# Altium footprint library lib.PcbLib: 145 footprints (part 1 of 10)
Each footprint in its own frame and in the unit in brackets; x right, y up, seen from the top. Pads: shape width x height; smd on the part's side, far side on the other; paste and mask are expansions set on the pad; w line width, h text height; cw(c..) or ccw(c..) is an arc to the next point about the centre after c.
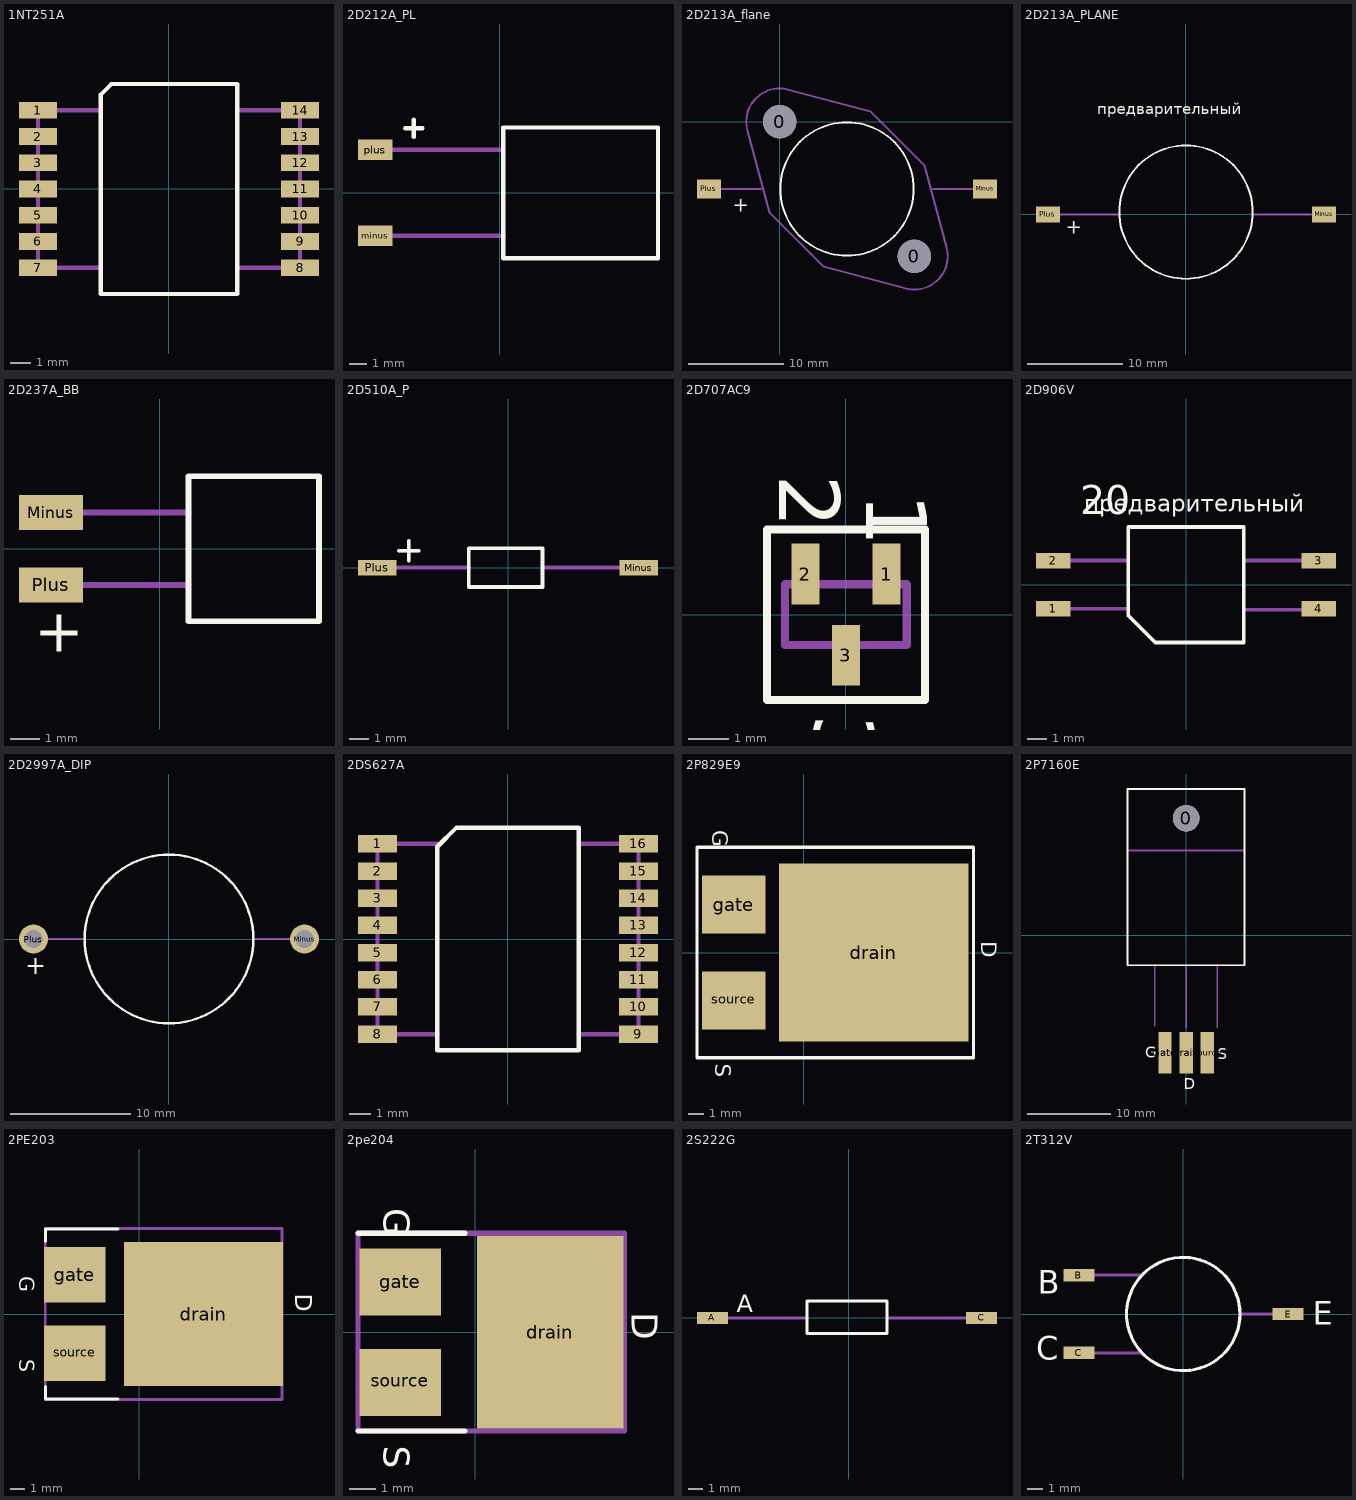
[diagram p0: the footprints below, top view; thin cyan lines are the x and y axes]

## 1NT251A [mm]
pads (14):
  rect 1.8x0.8 smd: 1(-6.25,3.75) 2(-6.25,2.5) 3(-6.25,1.25) 4(-6.25,0) 5(-6.25,-1.25) 6(-6.25,-2.5) 7(-6.25,-3.75) 8(6.25,-3.75) 9(6.25,-2.5) 10(6.25,-1.25) 11(6.25,0) 12(6.25,1.25) 13(6.25,2.5) 14(6.25,3.75)
Top Overlay:
  lines w0.2: -3.25,-5 -3.25,4.5 -2.75,5 3.25,5 3.25,-5 -3.25,-5
Mechanical 5:
  lines w0.2: -3.25,-3.75 -6.25,-3.75 -6.25,3.75 -3.25,3.75 ; 3.25,-3.75 6.25,-3.75 6.25,3.75 3.25,3.75
Mechanical 25:
  text "1" at -4.325,3.275 h2
  text "7" at -4.425,-4.525 h2
  text "8" at 4.025,-4.45 h2
  text "14" at 3.375,3.1 h2
3D body "401_14_03.stp": height 3.1, standoff 0, extent -6.6,-4.9 6.6,4.9

## 2D212A_PL [mm]
height 4
pads (2):
  rect 2x1.2 smd: minus(-7.25,-2.5) plus(-7.25,2.5)
Top Overlay:
  lines w0.254: -5.5,3.75 -4.5,3.75 ; -5,3.25 -5,4.25 ; 0.2,-3.8 0.2,3.8 9.2,3.8 9.2,-3.8 0.2,-3.8
Mechanical 5:
  lines w0.254: -7.25,-2.5 0.2,-2.5 ; -7.25,2.5 0.1,2.5
Mechanical 25:
  text "+" at -5.975,1.625 h2
3D body "2d212a_co.stp": height 4, standoff 0, extent -7.2,-4.1 9.3,3.9

## 2D213A_flane [mm] "m=4,0g"
height 4.5
pads (4):
  round 3.5 hole 3.5 unplated: 0(0,0)
  round 3.5 hole 3.5 unplated mask+0.102: 0(14.14,-14.14)
  rect 2.5x2 smd: Minus(21.57,-7.058) Plus(-7.43,-7.058)
Top Overlay:
  circle w0.2: c7.07,-7.074 r7
  text "+" at -4.93,-9.439 h1.5
Mechanical 5:
  lines w0.2: -7.555,-7.064 -1.93,-7.064 ; 0.97,3.33 9.52,1.08 15.22,-4.62 17.52,-13.17 ; 0.974,3.343 ccw(c-0.012,-0.015) -3.379,-0.97 -1.08,-9.52 4.62,-15.22 13.27,-17.52 ; 13.225,-17.5 ccw(c14.152,-14.125) 17.528,-13.204 ; 16.07,-7.064 21.445,-7.064
3D body: height 4, standoff 0, extent -3.5,-17.7 17.6,3.5
3D body: height 4.5, standoff 0, extent 0,-14.1 14,-0.1

## 2D213A_PLANE [mm] "m=4,0g"
height 4.5
pads (2):
  rect 2.5x1.7 smd: Minus(14.5,0) Plus(-14.5,0)
Top Overlay:
  circle w0.2: c0,0.25 r7
  text "+" at -12.6,-2 h1.5
  text "предварительный" at -9.3,10.1 h2
Mechanical 5:
  lines w0.2: -13.25,0 -7,0 ; 7,0 13.125,0

## 2D237A_BB [mm] "Install 11 massa 0.9 Form 41a.2147.025.06(ili po shertegu)"
height 2.5
pads (2):
  rect 2.2x1.2 smd: Minus(-3.75,1.25) Plus(-3.75,-1.25)
Top Overlay:
  lines w0.2: 1,-2.5 5.5,-2.5 5.5,2.5 1,2.5 1,-2.5
  text "+" at -4.318,-3.556 h1.5
Mechanical 5:
  lines w0.2: -4.25,1.25 1,1.25 ; -4,-1.25 1,-1.25
Mechanical 25:
  text "+" at -4,-3.1 h2

## 2D510A_P [mm]
height 1.8
pads (2):
  rect 2x0.8 smd: Minus(6.75,0) Plus(-6.75,0)
Top Overlay:
  lines w0.2: -5.625,0.875 -4.625,0.875 ; -5.125,0.375 -5.125,1.375 ; -2.025,-1 1.775,-1 1.775,1 -2.025,1 -2.025,-1
Mechanical 5:
  lines w0.2: -5.875,0 -2,0 ; 1.875,0 5.75,0
Mechanical 25:
  lines w0.2: -5.625,0.875 -4.625,0.875 ; -5.125,0.375 -5.125,1.375
3D body "2d510a.stp": height 1.8, standoff 0, extent -7.25,-0.9 7.25,0.9

## 2D707AC9 [mm] "М=0,01г, пластмассовый корпус, без прокладки,ручная пайка"
height 1.2
pads (3):
  rect 0.7x1.5 smd: 1(1,1) 2(-1,1) 3(0,-1)
Top Overlay:
  lines w0.2: -1.95,-2.1 1.95,-2.1 1.95,2.1 -1.95,2.1 -1.95,-2.1
  text "1" at 0.5,3 h1.5
  text "2" at -1.65,3.45 h1.5
  text "3" at -0.8,-2.45 h1.5
Mechanical 5:
  lines w0.2: -1,0.75 -1,1.25 ; 0,-1.25 0,-0.75 ; 1,0.75 1,1.25 ; -1.5,-0.75 -1.5,0.75 1.5,0.75 1.5,-0.75 -1.5,-0.75
Mechanical 25:
  text "3" at -0.65,-2.05 h2
  text "2" at -1.55,2.85 h2
  text "1" at 0.5,2.5 h2
3D body "2t3130a.stp": height 1.2, standoff 0, extent -1.5,-1.25 1.5,1.25

## 2D906V [mm]
height 3
pads (4):
  rect 1.8x0.8 smd: 1(-6.9,-1.25) 2(-6.9,1.25) 3(6.9,1.25) 4(6.9,-1.25)
Top Overlay:
  lines w0.2: -3,-1.6 -1.6,-3 3,-3 3,3 -3,3 -3,-1.6
  text "20" at -5.5,3.65 h1.5
  text "предварительный" at -5.3,3.5 h1.5
Mechanical 5:
  lines w0.2: -6.95,-1.25 -3.05,-1.25 ; -6.85,1.25 -3.1,1.25 ; 3.05,-1.3 6.95,-1.3 ; 3.05,1.25 6.8,1.25
Mechanical 25:
  text "4" at 4.55,-2.05 h3
  text "3" at 4.7,0.55 h3
  text "2" at -5.5,0.45 h3
  text "1" at -5.55,-2 h3

## 2D2997A_DIP [mm] "m=4,0g"
height 4.5
pads (2):
  round 2.4 hole 1.5: Minus(11.25,0) Plus(-11.25,0)
Top Overlay:
  circle w0.2: c0,0 r7
  text "+" at -11.943,-2.931 h1.5
Mechanical 5:
  lines w0.2: -11.25,0 -7,0 ; 7,0 11.25,0
Mechanical 25:
  text "+" at -11.75,-2.875 h2

## 2DS627A [mm]
height 2.8
pads (16):
  rect 1.8x0.8 smd: 1(-6,4.375) 2(-6,3.125) 3(-6,1.875) 4(-6,0.625) 5(-6,-0.625) 6(-6,-1.875) 7(-6,-3.125) 8(-6,-4.375) 9(6,-4.375) 10(6,-3.125) 11(6,-1.875) 12(6,-0.625) 13(6,0.625) 14(6,1.875) 15(6,3.125) 16(6,4.375)
Top Overlay:
  lines w0.2: -3.25,-5.125 -3.25,4.245 -2.37,5.125 3.25,5.125 3.25,-5.125 -3.25,-5.125
Mechanical 5:
  lines w0.2: -3.25,-4.375 -6,-4.375 -6,4.375 -3.25,4.375 ; 3.25,-4.375 6,-4.375 6,4.375 3.25,4.375
Mechanical 25:
  text "9" at 4,-5.025 h2
  text "8" at -4.6,-5.025 h2
  text "16" at 3.556,3.812 h2
  text "1" at -4.572,3.812 h2
3D body "CFP125P1240X250-16N.step": height 2.5, standoff 0, extent -6.25,-5 6.25,5

## 2P829E9 [mm]
height 3.6
pads (3):
  rect 12.05x11.35 smd: drain(4.45,0)
  rect 4.05x3.7 smd: gate(-4.45,3.05) source(-4.45,-3.05)
Top Overlay:
  lines w0.2: -6.8,-6.7 10.8,-6.7 10.8,6.7 -6.8,6.7 -6.8,-6.7
  text "D" at 11.3,0.725 h1
  text "S" at -5.625,-7.075 h1
  text "G" at -5.825,7.8 h1
Top Paste:
  region: -1.275,0.25 2.325,0.25 2.325,5.25 -1.275,5.25
  region: 2.725,0.25 6.325,0.25 6.325,5.25 2.725,5.25
  region: 6.725,0.25 10.225,0.25 10.225,5.25 6.725,5.25
  region: 6.725,-5.25 10.225,-5.25 10.225,-0.25 6.725,-0.25
  region: 2.725,-5.25 6.325,-5.25 6.325,-0.25 2.725,-0.25
  region: -1.275,-5.25 2.325,-5.25 2.325,-0.25 -1.275,-0.25
Mechanical 25:
  text "D" at 11.075,0.575 h1.5
  text "S" at -5.3,-5.35 h1.5
  text "G" at -4.9,6.35 h1.5
3D body: height 3.6, standoff 0.4, extent -6.8,-6.7 10.8,6.7
3D body: height 0.4, standoff 0, extent -1.6,-5.6 10.4,5.7
3D body: height 0.4, standoff 0, extent -6.4,1.2 -2.4,4.8
3D body: height 0.4, standoff 0, extent -6.4,-4.8 -2.4,-1.2

## 2P7160E [mm]
height 6.6
pads (4):
  round 3.2 hole 3.2 unplated: 0(0,14.063)
  rect 1.6x5 smd: Drain(0,-14.062) Gate(-2.54,-14.062) Source(2.54,-14.062)
Top Overlay:
  lines w0.2: -7.025,17.562 -7.025,-3.562 7,-3.562 7,17.562 -7,17.562
  text "D" at -0.3,-18.425 h1.31
  text "S" at 3.825,-14.875 h1.31
  text "G" at -4.875,-14.675 h1.31
Mechanical 5:
  lines w0.2: -7,10.188 -1.225,10.188 1.875,10.188 5,10.188 6.875,10.188 ; -3.767,-3.537 -3.75,-3.687 -3.75,-10.812 ; 0,-11.063 0,-3.562 ; 3.75,-11.063 3.75,-3.562
Mechanical 25:
  text "S" at 2.1,-11.3 h2
  text "D" at -0.5,-11.1 h2
  text "G" at -3,-11.2 h2

## 2PE203 [mm]
height 3.6
pads (3):
  rect 10.75x9.75 smd: drain(4.35,0)
  rect 4.15x3.75 smd: gate(-4.35,2.665) source(-4.35,-2.665)
Top Overlay:
  lines w0.2: -6.35,-4.89 -6.35,-5.75 -1.45,-5.75 ; -6.35,4.89 -6.35,5.75 -1.45,5.75
  text "D" at 10.15,1.375 h2
  text "G" at -8.129,2.54 h1
  text "S" at -8.129,-3.048 h1
Top Paste:
  rectangle: 3.025,0.375 5.775,4.375
  rectangle: 6.65,0.375 9.275,4.375
  rectangle: 6.525,-4.25 9.15,-0.455
  rectangle: 3.025,-4.25 5.831,-0.455
  rectangle: -0.35,0.375 2.275,4.375
  rectangle: -0.419,-4.25 2.275,-0.455
Mechanical 5:
  lines w0.2: -6.355,-5.77 9.655,-5.77 9.655,5.77 -6.355,5.77 -6.355,-5.77
Mechanical 25:
  text "D" at 10.15,2.625 h2
  text "G" at -5.1,5.75 h2
  text "S" at -4.725,-4.75 h2
3D body: height 3.6, standoff 0, extent -6.4,-5.8 9.7,5.8

## 2pe204 [mm]
height 3.05
pads (3):
  rect 5.55x7.3 smd: drain(2.85,0)
  rect 3.1x2.55 smd: gate(-2.85,1.905) source(-2.85,-1.905)
Top Overlay:
  lines w0.2: -4.45,-3.75 -0.4,-3.75 ; -4.45,3.75 -0.4,3.75
  text "D" at 5.934,0.762 h1
  text "G" at -3.464,4.699 h1
  text "S" at -3.464,-4.318 h1
Top Paste:
  region: 5.35,-1.558 3.144,-1.558 3.144,-3.375 5.35,-3.375
  region: 3.144,1.442 5.35,1.442 5.35,3.375 3.144,3.375
  region: 2.769,-3.375 2.769,-1.558 0.35,-1.558 0.35,-3.375
  region: 2.769,3.375 0.35,3.375 0.35,1.442 2.769,1.442
  region: 5.35,1 3.144,1 3.144,-1 5.35,-1
  region: 2.769,1 0.35,1 0.35,-1 2.769,-1
Mechanical 5:
  lines w0.2: -4.45,-3.75 -4.45,3.75 5.65,3.75 5.65,-3.75 -4.45,-3.75
Mechanical 25:
  text "S" at -3.4,-3.625 h1.5
  text "G" at -3.4,4.375 h1.5
  text "D" at 5.934,0.635 h1.5

## 2S222G [mm] "m_0,2g;"
height 2
pads (2):
  rect 2.1x0.8 smd: A(-9.25,0) C(9,0)
Top Overlay:
  lines w0.2: -2.85,-1.05 2.6,-1.05 2.6,0 2.6,1.15 -2.85,1.15 -2.85,-1.05
  text "A" at -7.62,0.381 h1.2
Mechanical 5:
  lines w0.2: -9.25,0 -2.85,0 ; 2.6,0 9,0
Mechanical 25:
  text "A" at -7.875,-0.5 h2
  text "C" at 6.3,-0.7 h2
3D body "2s222g.stp": height 2.2, standoff 0, extent -9.65,-1.1 9.65,1.1

## 2T312V [mm] "И93.365.065ГЧ(h3,25 max);ЖК3.365.143ГЧ(h4,3 max)"
height 6.1
pads (3):
  rect 2x0.8 smd: B(-6.737,2.5) C(-6.737,-2.5) E(6.737,0)
Top Overlay:
  circle w0.2: c-0.012,0 r3.65
  text "B" at -9.4,1.3 h1.5
  text "C" at -9.5,-2.95 h1.5
  text "E" at 8.325,-0.7 h1.5
Mechanical 5:
  lines w0.2: -6.638,-2.5 -2.75,-2.5 ; -6.638,2.5 -2.65,2.525 ; 3.6,0 6.638,0
Mechanical 25:
  text "E" at 3.925,-0.75 h2
  text "B" at -4.925,1.55 h2
  text "C" at -4.8,-2.675 h2